# Altium schematic symbol library jlcpcb_2025_04_ferrites_extended_0603.schlib: 833 symbols (part 1 of 4) (continued)
## BLM18KG300TN1D
designator FB?  Impedance @ Frequency: 30Ω@100MHz
Ferrite, 30Ω@100MHz, ±25%, 10mΩ, 5A, SMD 0603; Manufacturer: Murata Electronics; Manufacturer Part Number: BLM18KG300TN1D; Package Size: 0603; JLCPCB Basic Part: No; JLCPCB Part Number: C88982; Supplier 1: LCSC; Category: Ferrite Beads; Supplier Part Number 1: C88982; Tolerance: ±25%; Rated Current: 5A; DC Resistance: 10mΩ; RoHS: Yes; ComponentLink1Description: Datasheet; ComponentLink1URL: https://wmsc.lcsc.com/wmsc/upload/file/pdf/v2/lcsc/2304140030_Murata-Electronics-BLM18KG300TN1D_C88982.pdf; ComponentLink2Description: JLCPCB Part URL; ComponentLink2URL: https://jlcpcb.com/partdetail/C88982; ComponentLink3Description: LCSC Part URL; ComponentLink3URL: https://lcsc.com/product-detail/Ferrite-Beads_Murata-Electronics-Murata-Electronics-BLM18KG300TN1D_C88982.html
footprint FB-0603 (0603 (1608M) Ferrite)
pins: 1, 2

## BLM18KG300TZ1D
designator FB?  Impedance @ Frequency: 300Ω@100MHz
Ferrite, 300Ω@100MHz, 10mΩ, SMD 0603; Manufacturer: Murata Electronics; Manufacturer Part Number: BLM18KG300TZ1D; Package Size: 0603; JLCPCB Basic Part: No; JLCPCB Part Number: C596493; Supplier 1: LCSC; Category: Ferrite Beads; Supplier Part Number 1: C596493; DC Resistance: 10mΩ; RoHS: Yes; ComponentLink1Description: Datasheet; ComponentLink1URL: https://wmsc.lcsc.com/wmsc/upload/file/pdf/v2/lcsc/2304140030_Murata-Electronics-BLM18KG300TZ1D_C596493.pdf; ComponentLink2Description: JLCPCB Part URL; ComponentLink2URL: https://jlcpcb.com/partdetail/C596493; ComponentLink3Description: LCSC Part URL; ComponentLink3URL: https://lcsc.com/product-detail/Ferrite-Beads_Murata-Electronics-Murata-Electronics-BLM18KG300TZ1D_C596493.html
pins: 1, 2

## BLM18KG331SH1D
designator FB?  Impedance @ Frequency: 330Ω@100MHz
Ferrite, 330Ω@100MHz, ±25%, 80mΩ, 1.7A, SMD 0603; Manufacturer: Murata Electronics; Manufacturer Part Number: BLM18KG331SH1D; Package Size: 0603; JLCPCB Basic Part: No; JLCPCB Part Number: C710376; Supplier 1: LCSC; Category: Ferrite Beads; Supplier Part Number 1: C710376; Tolerance: ±25%; Rated Current: 1.7A; DC Resistance: 80mΩ; RoHS: Yes; ComponentLink1Description: Datasheet; ComponentLink1URL: https://wmsc.lcsc.com/wmsc/upload/file/pdf/v2/lcsc/2304140030_Murata-Electronics-BLM18KG331SH1D_C710376.pdf; ComponentLink2Description: JLCPCB Part URL; ComponentLink2URL: https://jlcpcb.com/partdetail/C710376; ComponentLink3Description: LCSC Part URL; ComponentLink3URL: https://lcsc.com/product-detail/Ferrite-Beads_Murata-Electronics-Murata-Electronics-BLM18KG331SH1D_C710376.html
footprint FB-0603 (0603 (1608M) Ferrite)
pins: 1, 2

## BLM18KG331SN1D
designator FB?  Impedance @ Frequency: 330Ω@100MHz
Ferrite, 330Ω@100MHz, ±25%, 80mΩ, 1.7A, SMD 0603; Manufacturer: Murata Electronics; Manufacturer Part Number: BLM18KG331SN1D; Package Size: 0603; JLCPCB Basic Part: No; JLCPCB Part Number: C85832; Supplier 1: LCSC; Category: Ferrite Beads; Supplier Part Number 1: C85832; Tolerance: ±25%; Rated Current: 1.7A; DC Resistance: 80mΩ; RoHS: Yes; ComponentLink1Description: Datasheet; ComponentLink1URL: https://wmsc.lcsc.com/wmsc/upload/file/pdf/v2/lcsc/2304140030_Murata-Electronics-BLM18KG331SN1D_C85832.pdf; ComponentLink2Description: JLCPCB Part URL; ComponentLink2URL: https://jlcpcb.com/partdetail/C85832; ComponentLink3Description: LCSC Part URL; ComponentLink3URL: https://lcsc.com/product-detail/Ferrite-Beads_Murata-Electronics-Murata-Electronics-BLM18KG331SN1D_C85832.html
footprint FB-0603 (0603 (1608M) Ferrite)
pins: 1, 2

## BLM18KG331SZ1D
designator FB?  Impedance @ Frequency: 330Ω@100MHz
Ferrite, 330Ω@100MHz, ±25%, 80mΩ, 1.7A, SMD 0603; Manufacturer: Murata Electronics; Manufacturer Part Number: BLM18KG331SZ1D; Package Size: 0603; JLCPCB Basic Part: No; JLCPCB Part Number: C710377; Supplier 1: LCSC; Category: Ferrite Beads; Supplier Part Number 1: C710377; Tolerance: ±25%; Rated Current: 1.7A; DC Resistance: 80mΩ; RoHS: Yes; ComponentLink1Description: Datasheet; ComponentLink1URL: https://wmsc.lcsc.com/wmsc/upload/file/pdf/v2/lcsc/2304140030_Murata-Electronics-BLM18KG331SZ1D_C710377.pdf; ComponentLink2Description: JLCPCB Part URL; ComponentLink2URL: https://jlcpcb.com/partdetail/C710377; ComponentLink3Description: LCSC Part URL; ComponentLink3URL: https://lcsc.com/product-detail/Ferrite-Beads_Murata-Electronics-Murata-Electronics-BLM18KG331SZ1D_C710377.html
footprint FB-0603 (0603 (1608M) Ferrite)
pins: 1, 2

## BLM18KG471SN1D
designator FB?  Impedance @ Frequency: 470Ω@100MHz
Ferrite, 470Ω@100MHz, ±25%, 130mΩ, 1.5A, SMD 0603; Manufacturer: Murata Electronics; Manufacturer Part Number: BLM18KG471SN1D; Package Size: 0603; JLCPCB Basic Part: No; JLCPCB Part Number: C413961; Supplier 1: LCSC; Category: Ferrite Beads; Supplier Part Number 1: C413961; Tolerance: ±25%; Rated Current: 1.5A; DC Resistance: 130mΩ; RoHS: Yes; ComponentLink1Description: Datasheet; ComponentLink1URL: https://wmsc.lcsc.com/wmsc/upload/file/pdf/v2/lcsc/1912111437_Murata-Electronics-BLM18KG471SN1D_C413961.pdf; ComponentLink2Description: JLCPCB Part URL; ComponentLink2URL: https://jlcpcb.com/partdetail/C413961; ComponentLink3Description: LCSC Part URL; ComponentLink3URL: https://lcsc.com/product-detail/Ferrite-Beads_Murata-Electronics-Murata-Electronics-BLM18KG471SN1D_C413961.html
footprint FB-0603 (0603 (1608M) Ferrite)
pins: 1, 2

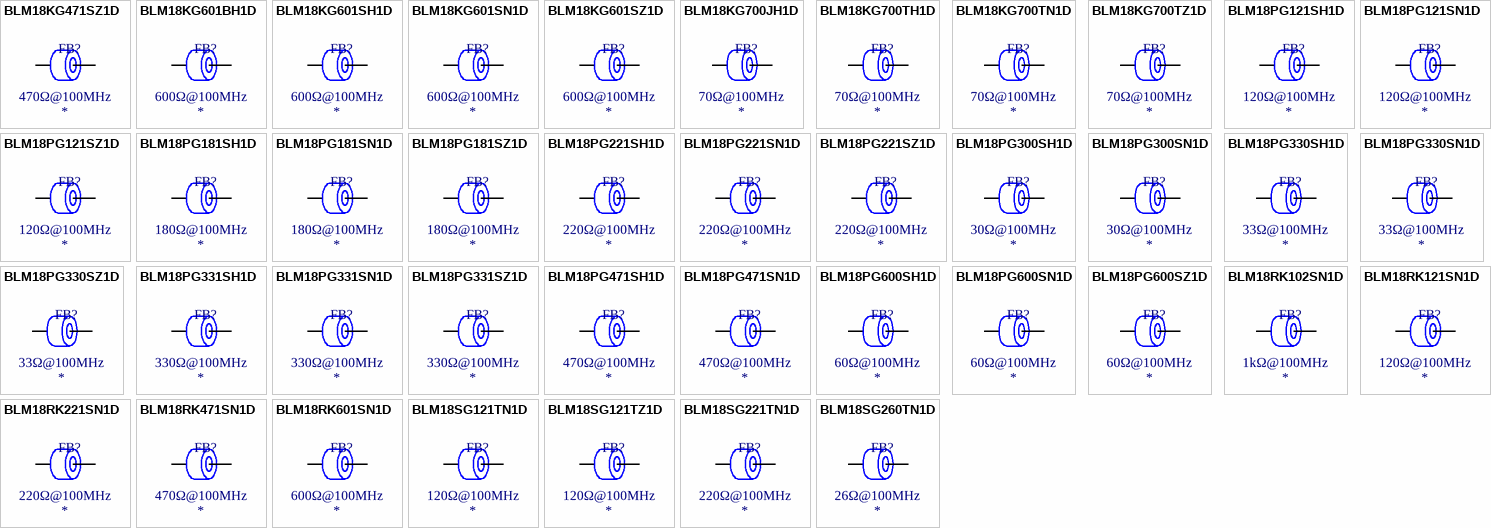
[diagram p4: symbols BLM18KG471SZ1D to BLM18SG260TN1D]

## BLM18KG471SZ1D
designator FB?  Impedance @ Frequency: 470Ω@100MHz
Ferrite, 470Ω@100MHz, ±25%, 130mΩ, 1.5A, SMD 0603; Manufacturer: Murata Electronics; Manufacturer Part Number: BLM18KG471SZ1D; Package Size: 0603; JLCPCB Basic Part: No; JLCPCB Part Number: C2661478; Supplier 1: LCSC; Category: Ferrite Beads; Supplier Part Number 1: C2661478; Tolerance: ±25%; Rated Current: 1.5A; DC Resistance: 130mΩ; RoHS: Yes; ComponentLink1Description: Datasheet; ComponentLink1URL: https://wmsc.lcsc.com/wmsc/upload/file/pdf/v2/lcsc/2304140030_Murata-Electronics-BLM18KG471SZ1D_C2661478.pdf; ComponentLink2Description: JLCPCB Part URL; ComponentLink2URL: https://jlcpcb.com/partdetail/C2661478; ComponentLink3Description: LCSC Part URL; ComponentLink3URL: https://lcsc.com/product-detail/Ferrite-Beads_Murata-Electronics-Murata-Electronics-BLM18KG471SZ1D_C2661478.html
footprint FB-0603 (0603 (1608M) Ferrite)
pins: 1, 2

## BLM18KG601BH1D
designator FB?  Impedance @ Frequency: 600Ω@100MHz
Ferrite, 600Ω@100MHz, 150mΩ, SMD 0603; Manufacturer: Murata Electronics; Manufacturer Part Number: BLM18KG601BH1D; Package Size: 0603; JLCPCB Basic Part: No; JLCPCB Part Number: C668302; Supplier 1: LCSC; Category: Ferrite Beads; Supplier Part Number 1: C668302; DC Resistance: 150mΩ; RoHS: Yes; ComponentLink1Description: Datasheet; ComponentLink1URL: https://wmsc.lcsc.com/wmsc/upload/file/pdf/v2/lcsc/2302070930_Murata-Electronics-BLM18KG601BH1D_C668302.pdf; ComponentLink2Description: JLCPCB Part URL; ComponentLink2URL: https://jlcpcb.com/partdetail/C668302; ComponentLink3Description: LCSC Part URL; ComponentLink3URL: https://lcsc.com/product-detail/Ferrite-Beads_Murata-Electronics-Murata-Electronics-BLM18KG601BH1D_C668302.html
pins: 1, 2

## BLM18KG601SH1D
designator FB?  Impedance @ Frequency: 600Ω@100MHz
Ferrite, 600Ω@100MHz, ±25%, 150mΩ, 1.3A, SMD 0603; Manufacturer: Murata Electronics; Manufacturer Part Number: BLM18KG601SH1D; Package Size: 0603; JLCPCB Basic Part: No; JLCPCB Part Number: C710379; Supplier 1: LCSC; Category: Ferrite Beads; Supplier Part Number 1: C710379; Tolerance: ±25%; Rated Current: 1.3A; DC Resistance: 150mΩ; RoHS: Yes; ComponentLink1Description: Datasheet; ComponentLink1URL: https://wmsc.lcsc.com/wmsc/upload/file/pdf/v2/lcsc/2304140030_Murata-Electronics-BLM18KG601SH1D_C710379.pdf; ComponentLink2Description: JLCPCB Part URL; ComponentLink2URL: https://jlcpcb.com/partdetail/C710379; ComponentLink3Description: LCSC Part URL; ComponentLink3URL: https://lcsc.com/product-detail/Ferrite-Beads_Murata-Electronics-Murata-Electronics-BLM18KG601SH1D_C710379.html
footprint FB-0603 (0603 (1608M) Ferrite)
pins: 1, 2

## BLM18KG601SN1D
designator FB?  Impedance @ Frequency: 600Ω@100MHz
Ferrite, 600Ω@100MHz, ±25%, 150mΩ, 1.3A, SMD 0603; Manufacturer: Murata Electronics; Manufacturer Part Number: BLM18KG601SN1D; Package Size: 0603; JLCPCB Basic Part: No; JLCPCB Part Number: C85833; Supplier 1: LCSC; Category: Ferrite Beads; Supplier Part Number 1: C85833; Tolerance: ±25%; Rated Current: 1.3A; DC Resistance: 150mΩ; RoHS: Yes; ComponentLink1Description: Datasheet; ComponentLink1URL: https://wmsc.lcsc.com/wmsc/upload/file/pdf/v2/lcsc/2304140030_Murata-Electronics-BLM18KG601SN1D_C85833.pdf; ComponentLink2Description: JLCPCB Part URL; ComponentLink2URL: https://jlcpcb.com/partdetail/C85833; ComponentLink3Description: LCSC Part URL; ComponentLink3URL: https://lcsc.com/product-detail/Ferrite-Beads_Murata-Electronics-Murata-Electronics-BLM18KG601SN1D_C85833.html
footprint FB-0603 (0603 (1608M) Ferrite)
pins: 1, 2

## BLM18KG601SZ1D
designator FB?  Impedance @ Frequency: 600Ω@100MHz
Ferrite, 600Ω@100MHz, ±25%, 150mΩ, 1.3A, SMD 0603; Manufacturer: Murata Electronics; Manufacturer Part Number: BLM18KG601SZ1D; Package Size: 0603; JLCPCB Basic Part: No; JLCPCB Part Number: C710380; Supplier 1: LCSC; Category: Ferrite Beads; Supplier Part Number 1: C710380; Tolerance: ±25%; Rated Current: 1.3A; DC Resistance: 150mΩ; RoHS: Yes; ComponentLink1Description: Datasheet; ComponentLink1URL: https://wmsc.lcsc.com/wmsc/upload/file/pdf/v2/lcsc/2304140030_Murata-Electronics-BLM18KG601SZ1D_C710380.pdf; ComponentLink2Description: JLCPCB Part URL; ComponentLink2URL: https://jlcpcb.com/partdetail/C710380; ComponentLink3Description: LCSC Part URL; ComponentLink3URL: https://lcsc.com/product-detail/Ferrite-Beads_Murata-Electronics-Murata-Electronics-BLM18KG601SZ1D_C710380.html
footprint FB-0603 (0603 (1608M) Ferrite)
pins: 1, 2

## BLM18KG700JH1D
designator FB?  Impedance @ Frequency: 70Ω@100MHz
Ferrite, 70Ω@100MHz, ±25%, 22mΩ, 2.2A, SMD 0603; Manufacturer: Murata Electronics; Manufacturer Part Number: BLM18KG700JH1D; Package Size: 0603; JLCPCB Basic Part: No; JLCPCB Part Number: C596492; Supplier 1: LCSC; Category: Ferrite Beads; Supplier Part Number 1: C596492; Tolerance: ±25%; Rated Current: 2.2A; DC Resistance: 22mΩ; RoHS: Yes; ComponentLink1Description: Datasheet; ComponentLink1URL: https://wmsc.lcsc.com/wmsc/upload/file/pdf/v2/lcsc/2304140030_Murata-Electronics-BLM18KG700JH1D_C596492.pdf; ComponentLink2Description: JLCPCB Part URL; ComponentLink2URL: https://jlcpcb.com/partdetail/C596492; ComponentLink3Description: LCSC Part URL; ComponentLink3URL: https://lcsc.com/product-detail/Ferrite-Beads_Murata-Electronics-Murata-Electronics-BLM18KG700JH1D_C596492.html
footprint FB-0603 (0603 (1608M) Ferrite)
pins: 1, 2

## BLM18KG700TH1D
designator FB?  Impedance @ Frequency: 70Ω@100MHz
Ferrite, 70Ω@100MHz, ±25%, 22mΩ, 3.5A, SMD 0603; Manufacturer: Murata Electronics; Manufacturer Part Number: BLM18KG700TH1D; Package Size: 0603; JLCPCB Basic Part: No; JLCPCB Part Number: C710381; Supplier 1: LCSC; Category: Ferrite Beads; Supplier Part Number 1: C710381; Tolerance: ±25%; Rated Current: 3.5A; DC Resistance: 22mΩ; RoHS: Yes; ComponentLink1Description: Datasheet; ComponentLink1URL: https://wmsc.lcsc.com/wmsc/upload/file/pdf/v2/lcsc/2201131100_Murata-Electronics-BLM18KG700TH1D_C710381.pdf; ComponentLink2Description: JLCPCB Part URL; ComponentLink2URL: https://jlcpcb.com/partdetail/C710381; ComponentLink3Description: LCSC Part URL; ComponentLink3URL: https://lcsc.com/product-detail/Ferrite-Beads_Murata-Electronics-Murata-Electronics-BLM18KG700TH1D_C710381.html
footprint FB-0603 (0603 (1608M) Ferrite)
pins: 1, 2

## BLM18KG700TN1D
designator FB?  Impedance @ Frequency: 70Ω@100MHz
Ferrite, 70Ω@100MHz, ±25%, 22mΩ, 3.5A, SMD 0603; Manufacturer: Murata Electronics; Manufacturer Part Number: BLM18KG700TN1D; Package Size: 0603; JLCPCB Basic Part: No; JLCPCB Part Number: C113029; Supplier 1: LCSC; Category: Ferrite Beads; Supplier Part Number 1: C113029; Tolerance: ±25%; Rated Current: 3.5A; DC Resistance: 22mΩ; RoHS: Yes; ComponentLink1Description: Datasheet; ComponentLink1URL: https://wmsc.lcsc.com/wmsc/upload/file/pdf/v2/lcsc/2304140030_Murata-Electronics-BLM18KG700TN1D_C113029.pdf; ComponentLink2Description: JLCPCB Part URL; ComponentLink2URL: https://jlcpcb.com/partdetail/C113029; ComponentLink3Description: LCSC Part URL; ComponentLink3URL: https://lcsc.com/product-detail/Ferrite-Beads_Murata-Electronics-Murata-Electronics-BLM18KG700TN1D_C113029.html
footprint FB-0603 (0603 (1608M) Ferrite)
pins: 1, 2

## BLM18KG700TZ1D
designator FB?  Impedance @ Frequency: 70Ω@100MHz
Ferrite, 70Ω@100MHz, ±25%, 22mΩ, 3.5A, SMD 0603; Manufacturer: Murata Electronics; Manufacturer Part Number: BLM18KG700TZ1D; Package Size: 0603; JLCPCB Basic Part: No; JLCPCB Part Number: C710382; Supplier 1: LCSC; Category: Ferrite Beads; Supplier Part Number 1: C710382; Tolerance: ±25%; Rated Current: 3.5A; DC Resistance: 22mΩ; RoHS: Yes; ComponentLink1Description: Datasheet; ComponentLink1URL: https://wmsc.lcsc.com/wmsc/upload/file/pdf/v2/lcsc/2304140030_Murata-Electronics-BLM18KG700TZ1D_C710382.pdf; ComponentLink2Description: JLCPCB Part URL; ComponentLink2URL: https://jlcpcb.com/partdetail/C710382; ComponentLink3Description: LCSC Part URL; ComponentLink3URL: https://lcsc.com/product-detail/Ferrite-Beads_Murata-Electronics-Murata-Electronics-BLM18KG700TZ1D_C710382.html
footprint FB-0603 (0603 (1608M) Ferrite)
pins: 1, 2

## BLM18PG121SH1D
designator FB?  Impedance @ Frequency: 120Ω@100MHz
Ferrite, 120Ω@100MHz, ±25%, 50mΩ, 2A, SMD 0603; Manufacturer: Murata Electronics; Manufacturer Part Number: BLM18PG121SH1D; Package Size: 0603; JLCPCB Basic Part: No; JLCPCB Part Number: C354394; Supplier 1: LCSC; Category: Ferrite Beads; Supplier Part Number 1: C354394; Tolerance: ±25%; Rated Current: 2A; DC Resistance: 50mΩ; RoHS: Yes; ComponentLink1Description: Datasheet; ComponentLink1URL: https://wmsc.lcsc.com/wmsc/upload/file/pdf/v2/lcsc/2304140030_Murata-Electronics-BLM18PG121SH1D_C354394.pdf; ComponentLink2Description: JLCPCB Part URL; ComponentLink2URL: https://jlcpcb.com/partdetail/C354394; ComponentLink3Description: LCSC Part URL; ComponentLink3URL: https://lcsc.com/product-detail/Ferrite-Beads_Murata-Electronics-Murata-Electronics-BLM18PG121SH1D_C354394.html
footprint FB-0603 (0603 (1608M) Ferrite)
pins: 1, 2

## BLM18PG121SN1D
designator FB?  Impedance @ Frequency: 120Ω@100MHz
Ferrite, 120Ω@100MHz, ±25%, 50mΩ, 2A, SMD 0603; Manufacturer: Murata Electronics; Manufacturer Part Number: BLM18PG121SN1D; Package Size: 0603; JLCPCB Basic Part: No; JLCPCB Part Number: C14709; Supplier 1: LCSC; Category: Ferrite Beads; Supplier Part Number 1: C14709; Tolerance: ±25%; Rated Current: 2A; DC Resistance: 50mΩ; RoHS: Yes; ComponentLink1Description: Datasheet; ComponentLink1URL: https://wmsc.lcsc.com/wmsc/upload/file/pdf/v2/lcsc/2304140030_Murata-Electronics-BLM18PG121SN1D_C14709.pdf; ComponentLink2Description: JLCPCB Part URL; ComponentLink2URL: https://jlcpcb.com/partdetail/C14709; ComponentLink3Description: LCSC Part URL; ComponentLink3URL: https://lcsc.com/product-detail/Ferrite-Beads_Murata-Electronics-Murata-Electronics-BLM18PG121SN1D_C14709.html
footprint FB-0603 (0603 (1608M) Ferrite)
pins: 1, 2

## BLM18PG121SZ1D
designator FB?  Impedance @ Frequency: 120Ω@100MHz
Ferrite, 120Ω@100MHz, ±25%, 50mΩ, 2A, SMD 0603; Manufacturer: Murata Electronics; Manufacturer Part Number: BLM18PG121SZ1D; Package Size: 0603; JLCPCB Basic Part: No; JLCPCB Part Number: C160983; Supplier 1: LCSC; Category: Ferrite Beads; Supplier Part Number 1: C160983; Tolerance: ±25%; Rated Current: 2A; DC Resistance: 50mΩ; RoHS: Yes; ComponentLink1Description: Datasheet; ComponentLink1URL: https://wmsc.lcsc.com/wmsc/upload/file/pdf/v2/lcsc/2304140030_Murata-Electronics-BLM18PG121SZ1D_C160983.pdf; ComponentLink2Description: JLCPCB Part URL; ComponentLink2URL: https://jlcpcb.com/partdetail/C160983; ComponentLink3Description: LCSC Part URL; ComponentLink3URL: https://lcsc.com/product-detail/Ferrite-Beads_Murata-Electronics-Murata-Electronics-BLM18PG121SZ1D_C160983.html
footprint FB-0603 (0603 (1608M) Ferrite)
pins: 1, 2

## BLM18PG181SH1D
designator FB?  Impedance @ Frequency: 180Ω@100MHz
Ferrite, 180Ω@100MHz, ±25%, 90mΩ, 1.5A, SMD 0603; Manufacturer: Murata Electronics; Manufacturer Part Number: BLM18PG181SH1D; Package Size: 0603; JLCPCB Basic Part: No; JLCPCB Part Number: C710383; Supplier 1: LCSC; Category: Ferrite Beads; Supplier Part Number 1: C710383; Tolerance: ±25%; Rated Current: 1.5A; DC Resistance: 90mΩ; RoHS: Yes; ComponentLink1Description: Datasheet; ComponentLink1URL: https://wmsc.lcsc.com/wmsc/upload/file/pdf/v2/lcsc/2304140030_Murata-Electronics-BLM18PG181SH1D_C710383.pdf; ComponentLink2Description: JLCPCB Part URL; ComponentLink2URL: https://jlcpcb.com/partdetail/C710383; ComponentLink3Description: LCSC Part URL; ComponentLink3URL: https://lcsc.com/product-detail/Ferrite-Beads_Murata-Electronics-Murata-Electronics-BLM18PG181SH1D_C710383.html
footprint FB-0603 (0603 (1608M) Ferrite)
pins: 1, 2

## BLM18PG181SN1D
designator FB?  Impedance @ Frequency: 180Ω@100MHz
Ferrite, 180Ω@100MHz, ±25%, 90mΩ, 1.5A, SMD 0603; Manufacturer: Murata Electronics; Manufacturer Part Number: BLM18PG181SN1D; Package Size: 0603; JLCPCB Basic Part: No; JLCPCB Part Number: C82850; Supplier 1: LCSC; Category: Ferrite Beads; Supplier Part Number 1: C82850; Tolerance: ±25%; Rated Current: 1.5A; DC Resistance: 90mΩ; RoHS: Yes; ComponentLink1Description: Datasheet; ComponentLink1URL: https://wmsc.lcsc.com/wmsc/upload/file/pdf/v2/lcsc/2304140030_Murata-Electronics-BLM18PG181SN1D_C82850.pdf; ComponentLink2Description: JLCPCB Part URL; ComponentLink2URL: https://jlcpcb.com/partdetail/C82850; ComponentLink3Description: LCSC Part URL; ComponentLink3URL: https://lcsc.com/product-detail/Ferrite-Beads_Murata-Electronics-Murata-Electronics-BLM18PG181SN1D_C82850.html
footprint FB-0603 (0603 (1608M) Ferrite)
pins: 1, 2

## BLM18PG181SZ1D
designator FB?  Impedance @ Frequency: 180Ω@100MHz
Ferrite, 180Ω@100MHz, 90mΩ, SMD 0603; Manufacturer: Murata Electronics; Manufacturer Part Number: BLM18PG181SZ1D; Package Size: 0603; JLCPCB Basic Part: No; JLCPCB Part Number: C560070; Supplier 1: LCSC; Category: Ferrite Beads; Supplier Part Number 1: C560070; DC Resistance: 90mΩ; RoHS: Yes; ComponentLink1Description: Datasheet; ComponentLink1URL: https://wmsc.lcsc.com/wmsc/upload/file/pdf/v2/lcsc/2008070932_Murata-Electronics-BLM18PG181SZ1D_C560070.pdf; ComponentLink2Description: JLCPCB Part URL; ComponentLink2URL: https://jlcpcb.com/partdetail/C560070; ComponentLink3Description: LCSC Part URL; ComponentLink3URL: https://lcsc.com/product-detail/Ferrite-Beads_Murata-Electronics-Murata-Electronics-BLM18PG181SZ1D_C560070.html
pins: 1, 2

## BLM18PG221SH1D
designator FB?  Impedance @ Frequency: 220Ω@100MHz
Ferrite, 220Ω@100MHz, 100mΩ, SMD 0603; Manufacturer: Murata Electronics; Manufacturer Part Number: BLM18PG221SH1D; Package Size: 0603; JLCPCB Basic Part: No; JLCPCB Part Number: C711569; Supplier 1: LCSC; Category: Ferrite Beads; Supplier Part Number 1: C711569; DC Resistance: 100mΩ; RoHS: Yes; ComponentLink1Description: Datasheet; ComponentLink1URL: https://wmsc.lcsc.com/wmsc/upload/file/pdf/v2/lcsc/2304140030_Murata-Electronics-BLM18PG221SH1D_C711569.pdf; ComponentLink2Description: JLCPCB Part URL; ComponentLink2URL: https://jlcpcb.com/partdetail/C711569; ComponentLink3Description: LCSC Part URL; ComponentLink3URL: https://lcsc.com/product-detail/Ferrite-Beads_Murata-Electronics-Murata-Electronics-BLM18PG221SH1D_C711569.html
pins: 1, 2

## BLM18PG221SN1D
designator FB?  Impedance @ Frequency: 220Ω@100MHz
Ferrite, 220Ω@100MHz, ±25%, 100mΩ, 1.4A, SMD 0603; Manufacturer: Murata Electronics; Manufacturer Part Number: BLM18PG221SN1D; Package Size: 0603; JLCPCB Basic Part: No; JLCPCB Part Number: C80165; Supplier 1: LCSC; Category: Ferrite Beads; Supplier Part Number 1: C80165; Tolerance: ±25%; Rated Current: 1.4A; DC Resistance: 100mΩ; RoHS: Yes; ComponentLink1Description: Datasheet; ComponentLink1URL: https://wmsc.lcsc.com/wmsc/upload/file/pdf/v2/lcsc/2304140030_Murata-Electronics-BLM18PG221SN1D_C80165.pdf; ComponentLink2Description: JLCPCB Part URL; ComponentLink2URL: https://jlcpcb.com/partdetail/C80165; ComponentLink3Description: LCSC Part URL; ComponentLink3URL: https://lcsc.com/product-detail/Ferrite-Beads_Murata-Electronics-Murata-Electronics-BLM18PG221SN1D_C80165.html
footprint FB-0603 (0603 (1608M) Ferrite)
pins: 1, 2

## BLM18PG221SZ1D
designator FB?  Impedance @ Frequency: 220Ω@100MHz
Ferrite, 220Ω@100MHz, ±25%, 100mΩ, 1.4A, SMD 0603; Manufacturer: Murata Electronics; Manufacturer Part Number: BLM18PG221SZ1D; Package Size: 0603; JLCPCB Basic Part: No; JLCPCB Part Number: C710384; Supplier 1: LCSC; Category: Ferrite Beads; Supplier Part Number 1: C710384; Tolerance: ±25%; Rated Current: 1.4A; DC Resistance: 100mΩ; RoHS: Yes; ComponentLink1Description: Datasheet; ComponentLink1URL: https://wmsc.lcsc.com/wmsc/upload/file/pdf/v2/lcsc/2304140030_Murata-Electronics-BLM18PG221SZ1D_C710384.pdf; ComponentLink2Description: JLCPCB Part URL; ComponentLink2URL: https://jlcpcb.com/partdetail/C710384; ComponentLink3Description: LCSC Part URL; ComponentLink3URL: https://lcsc.com/product-detail/Ferrite-Beads_Murata-Electronics-Murata-Electronics-BLM18PG221SZ1D_C710384.html
footprint FB-0603 (0603 (1608M) Ferrite)
pins: 1, 2

## BLM18PG300SH1D
designator FB?  Impedance @ Frequency: 30Ω@100MHz
Ferrite, 30Ω@100MHz, ±25%, 50mΩ, 1A, SMD 0603; Manufacturer: Murata Electronics; Manufacturer Part Number: BLM18PG300SH1D; Package Size: 0603; JLCPCB Basic Part: No; JLCPCB Part Number: C437405; Supplier 1: LCSC; Category: Ferrite Beads; Supplier Part Number 1: C437405; Tolerance: ±25%; Rated Current: 1A; DC Resistance: 50mΩ; RoHS: Yes; ComponentLink1Description: Datasheet; ComponentLink1URL: https://wmsc.lcsc.com/wmsc/upload/file/pdf/v2/lcsc/2304140030_Murata-Electronics-BLM18PG300SH1D_C437405.pdf; ComponentLink2Description: JLCPCB Part URL; ComponentLink2URL: https://jlcpcb.com/partdetail/C437405; ComponentLink3Description: LCSC Part URL; ComponentLink3URL: https://lcsc.com/product-detail/Ferrite-Beads_Murata-Electronics-Murata-Electronics-BLM18PG300SH1D_C437405.html
footprint FB-0603 (0603 (1608M) Ferrite)
pins: 1, 2

## BLM18PG300SN1D
designator FB?  Impedance @ Frequency: 30Ω@100MHz
Ferrite, 30Ω@100MHz, ±25%, 50mΩ, 1A, SMD 0603; Manufacturer: Murata Electronics; Manufacturer Part Number: BLM18PG300SN1D; Package Size: 0603; JLCPCB Basic Part: No; JLCPCB Part Number: C17305; Supplier 1: LCSC; Category: Ferrite Beads; Supplier Part Number 1: C17305; Tolerance: ±25%; Rated Current: 1A; DC Resistance: 50mΩ; RoHS: Yes; ComponentLink1Description: Datasheet; ComponentLink1URL: https://wmsc.lcsc.com/wmsc/upload/file/pdf/v2/lcsc/1810311122_Murata-Electronics-BLM18PG300SN1D_C17305.pdf; ComponentLink2Description: JLCPCB Part URL; ComponentLink2URL: https://jlcpcb.com/partdetail/C17305; ComponentLink3Description: LCSC Part URL; ComponentLink3URL: https://lcsc.com/product-detail/Ferrite-Beads_Murata-Electronics-Murata-Electronics-BLM18PG300SN1D_C17305.html
footprint FB-0603 (0603 (1608M) Ferrite)
pins: 1, 2

## BLM18PG330SH1D
designator FB?  Impedance @ Frequency: 33Ω@100MHz
Ferrite, 33Ω@100MHz, ±25%, 25mΩ, 3A, SMD 0603; Manufacturer: Murata Electronics; Manufacturer Part Number: BLM18PG330SH1D; Package Size: 0603; JLCPCB Basic Part: No; JLCPCB Part Number: C88983; Supplier 1: LCSC; Category: Ferrite Beads; Supplier Part Number 1: C88983; Tolerance: ±25%; Rated Current: 3A; DC Resistance: 25mΩ; RoHS: Yes; ComponentLink1Description: Datasheet; ComponentLink1URL: https://wmsc.lcsc.com/wmsc/upload/file/pdf/v2/lcsc/2304140030_Murata-Electronics-BLM18PG330SH1D_C88983.pdf; ComponentLink2Description: JLCPCB Part URL; ComponentLink2URL: https://jlcpcb.com/partdetail/C88983; ComponentLink3Description: LCSC Part URL; ComponentLink3URL: https://lcsc.com/product-detail/Ferrite-Beads_Murata-Electronics-Murata-Electronics-BLM18PG330SH1D_C88983.html
footprint FB-0603 (0603 (1608M) Ferrite)
pins: 1, 2

## BLM18PG330SN1D
designator FB?  Impedance @ Frequency: 33Ω@100MHz
Ferrite, 33Ω@100MHz, ±25%, 25mΩ, 3A, SMD 0603; Manufacturer: Murata Electronics; Manufacturer Part Number: BLM18PG330SN1D; Package Size: 0603; JLCPCB Basic Part: No; JLCPCB Part Number: C88984; Supplier 1: LCSC; Category: Ferrite Beads; Supplier Part Number 1: C88984; Tolerance: ±25%; Rated Current: 3A; DC Resistance: 25mΩ; RoHS: Yes; ComponentLink1Description: Datasheet; ComponentLink1URL: https://wmsc.lcsc.com/wmsc/upload/file/pdf/v2/lcsc/2304140030_Murata-Electronics-BLM18PG330SN1D_C88984.pdf; ComponentLink2Description: JLCPCB Part URL; ComponentLink2URL: https://jlcpcb.com/partdetail/C88984; ComponentLink3Description: LCSC Part URL; ComponentLink3URL: https://lcsc.com/product-detail/Ferrite-Beads_Murata-Electronics-Murata-Electronics-BLM18PG330SN1D_C88984.html
footprint FB-0603 (0603 (1608M) Ferrite)
pins: 1, 2

## BLM18PG330SZ1D
designator FB?  Impedance @ Frequency: 33Ω@100MHz
Ferrite, 33Ω@100MHz, 25mΩ, SMD 0603; Manufacturer: Murata Electronics; Manufacturer Part Number: BLM18PG330SZ1D; Package Size: 0603; JLCPCB Basic Part: No; JLCPCB Part Number: C3716705; Supplier 1: LCSC; Category: Ferrite Beads; Supplier Part Number 1: C3716705; DC Resistance: 25mΩ; RoHS: Yes; ComponentLink1Description: Datasheet; ComponentLink1URL: https://wmsc.lcsc.com/wmsc/upload/file/pdf/v2/lcsc/2308111557_Murata-Electronics-BLM18PG330SZ1D_C3716705.pdf; ComponentLink2Description: JLCPCB Part URL; ComponentLink2URL: https://jlcpcb.com/partdetail/C3716705; ComponentLink3Description: LCSC Part URL; ComponentLink3URL: https://lcsc.com/product-detail/Ferrite-Beads_Murata-Electronics-Murata-Electronics-BLM18PG330SZ1D_C3716705.html
pins: 1, 2

## BLM18PG331SH1D
designator FB?  Impedance @ Frequency: 330Ω@100MHz
Ferrite, 330Ω@100MHz, ±25%, 150mΩ, 1.2A, SMD 0603; Manufacturer: Murata Electronics; Manufacturer Part Number: BLM18PG331SH1D; Package Size: 0603; JLCPCB Basic Part: No; JLCPCB Part Number: C710386; Supplier 1: LCSC; Category: Ferrite Beads; Supplier Part Number 1: C710386; Tolerance: ±25%; Rated Current: 1.2A; DC Resistance: 150mΩ; RoHS: Yes; ComponentLink1Description: Datasheet; ComponentLink1URL: https://wmsc.lcsc.com/wmsc/upload/file/pdf/v2/lcsc/2304140030_Murata-Electronics-BLM18PG331SH1D_C710386.pdf; ComponentLink2Description: JLCPCB Part URL; ComponentLink2URL: https://jlcpcb.com/partdetail/C710386; ComponentLink3Description: LCSC Part URL; ComponentLink3URL: https://lcsc.com/product-detail/Ferrite-Beads_Murata-Electronics-Murata-Electronics-BLM18PG331SH1D_C710386.html
footprint FB-0603 (0603 (1608M) Ferrite)
pins: 1, 2

## BLM18PG331SN1D
designator FB?  Impedance @ Frequency: 330Ω@100MHz
Ferrite, 330Ω@100MHz, ±25%, 150mΩ, 1.2A, SMD 0603; Manufacturer: Murata Electronics; Manufacturer Part Number: BLM18PG331SN1D; Package Size: 0603; JLCPCB Basic Part: No; JLCPCB Part Number: C79913; Supplier 1: LCSC; Category: Ferrite Beads; Supplier Part Number 1: C79913; Tolerance: ±25%; Rated Current: 1.2A; DC Resistance: 150mΩ; RoHS: Yes; ComponentLink1Description: Datasheet; ComponentLink1URL: https://wmsc.lcsc.com/wmsc/upload/file/pdf/v2/lcsc/2304140030_Murata-Electronics-BLM18PG331SN1D_C79913.pdf; ComponentLink2Description: JLCPCB Part URL; ComponentLink2URL: https://jlcpcb.com/partdetail/C79913; ComponentLink3Description: LCSC Part URL; ComponentLink3URL: https://lcsc.com/product-detail/Ferrite-Beads_Murata-Electronics-Murata-Electronics-BLM18PG331SN1D_C79913.html
footprint FB-0603 (0603 (1608M) Ferrite)
pins: 1, 2

## BLM18PG331SZ1D
designator FB?  Impedance @ Frequency: 330Ω@100MHz
Ferrite, 330Ω@100MHz, ±25%, 150mΩ, 1.2A, SMD 0603; Manufacturer: Murata Electronics; Manufacturer Part Number: BLM18PG331SZ1D; Package Size: 0603; JLCPCB Basic Part: No; JLCPCB Part Number: C160984; Supplier 1: LCSC; Category: Ferrite Beads; Supplier Part Number 1: C160984; Tolerance: ±25%; Rated Current: 1.2A; DC Resistance: 150mΩ; RoHS: Yes; ComponentLink1Description: Datasheet; ComponentLink1URL: https://wmsc.lcsc.com/wmsc/upload/file/pdf/v2/lcsc/2304140030_Murata-Electronics-BLM18PG331SZ1D_C160984.pdf; ComponentLink2Description: JLCPCB Part URL; ComponentLink2URL: https://jlcpcb.com/partdetail/C160984; ComponentLink3Description: LCSC Part URL; ComponentLink3URL: https://lcsc.com/product-detail/Ferrite-Beads_Murata-Electronics-Murata-Electronics-BLM18PG331SZ1D_C160984.html
footprint FB-0603 (0603 (1608M) Ferrite)
pins: 1, 2

## BLM18PG471SH1D
designator FB?  Impedance @ Frequency: 470Ω@100MHz
Ferrite, 470Ω@100MHz, ±25%, 200mΩ, 1A, SMD 0603; Manufacturer: Murata Electronics; Manufacturer Part Number: BLM18PG471SH1D; Package Size: 0603; JLCPCB Basic Part: No; JLCPCB Part Number: C160985; Supplier 1: LCSC; Category: Ferrite Beads; Supplier Part Number 1: C160985; Tolerance: ±25%; Rated Current: 1A; DC Resistance: 200mΩ; RoHS: Yes; ComponentLink1Description: Datasheet; ComponentLink1URL: https://wmsc.lcsc.com/wmsc/upload/file/pdf/v2/lcsc/1810311131_Murata-Electronics-BLM18PG471SH1D_C160985.pdf; ComponentLink2Description: JLCPCB Part URL; ComponentLink2URL: https://jlcpcb.com/partdetail/C160985; ComponentLink3Description: LCSC Part URL; ComponentLink3URL: https://lcsc.com/product-detail/Ferrite-Beads_Murata-Electronics-Murata-Electronics-BLM18PG471SH1D_C160985.html
footprint FB-0603 (0603 (1608M) Ferrite)
pins: 1, 2

## BLM18PG471SN1D
designator FB?  Impedance @ Frequency: 470Ω@100MHz
Ferrite, 470Ω@100MHz, ±25%, 200mΩ, 1A, SMD 0603; Manufacturer: Murata Electronics; Manufacturer Part Number: BLM18PG471SN1D; Package Size: 0603; JLCPCB Basic Part: No; JLCPCB Part Number: C97853; Supplier 1: LCSC; Category: Ferrite Beads; Supplier Part Number 1: C97853; Tolerance: ±25%; Rated Current: 1A; DC Resistance: 200mΩ; RoHS: Yes; ComponentLink1Description: Datasheet; ComponentLink1URL: https://wmsc.lcsc.com/wmsc/upload/file/pdf/v2/lcsc/2304140030_Murata-Electronics-BLM18PG471SN1D_C97853.pdf; ComponentLink2Description: JLCPCB Part URL; ComponentLink2URL: https://jlcpcb.com/partdetail/C97853; ComponentLink3Description: LCSC Part URL; ComponentLink3URL: https://lcsc.com/product-detail/Ferrite-Beads_Murata-Electronics-Murata-Electronics-BLM18PG471SN1D_C97853.html
footprint FB-0603 (0603 (1608M) Ferrite)
pins: 1, 2

## BLM18PG600SH1D
designator FB?  Impedance @ Frequency: 60Ω@100MHz
Ferrite, 60Ω@100MHz, ±25%, 100mΩ, 1A, SMD 0603; Manufacturer: Murata Electronics; Manufacturer Part Number: BLM18PG600SH1D; Package Size: 0603; JLCPCB Basic Part: No; JLCPCB Part Number: C88985; Supplier 1: LCSC; Category: Ferrite Beads; Supplier Part Number 1: C88985; Tolerance: ±25%; Rated Current: 1A; DC Resistance: 100mΩ; RoHS: Yes; ComponentLink1Description: Datasheet; ComponentLink1URL: https://wmsc.lcsc.com/wmsc/upload/file/pdf/v2/lcsc/1810311125_Murata-Electronics-BLM18PG600SH1D_C88985.pdf; ComponentLink2Description: JLCPCB Part URL; ComponentLink2URL: https://jlcpcb.com/partdetail/C88985; ComponentLink3Description: LCSC Part URL; ComponentLink3URL: https://lcsc.com/product-detail/Ferrite-Beads_Murata-Electronics-Murata-Electronics-BLM18PG600SH1D_C88985.html
footprint FB-0603 (0603 (1608M) Ferrite)
pins: 1, 2

## BLM18PG600SN1D
designator FB?  Impedance @ Frequency: 60Ω@100MHz
Ferrite, 60Ω@100MHz, ±25%, 100mΩ, 1A, SMD 0603; Manufacturer: Murata Electronics; Manufacturer Part Number: BLM18PG600SN1D; Package Size: 0603; JLCPCB Basic Part: No; JLCPCB Part Number: C85834; Supplier 1: LCSC; Category: Ferrite Beads; Supplier Part Number 1: C85834; Tolerance: ±25%; Rated Current: 1A; DC Resistance: 100mΩ; RoHS: Yes; ComponentLink1Description: Datasheet; ComponentLink1URL: https://wmsc.lcsc.com/wmsc/upload/file/pdf/v2/lcsc/2304140030_Murata-Electronics-BLM18PG600SN1D_C85834.pdf; ComponentLink2Description: JLCPCB Part URL; ComponentLink2URL: https://jlcpcb.com/partdetail/C85834; ComponentLink3Description: LCSC Part URL; ComponentLink3URL: https://lcsc.com/product-detail/Ferrite-Beads_Murata-Electronics-Murata-Electronics-BLM18PG600SN1D_C85834.html
footprint FB-0603 (0603 (1608M) Ferrite)
pins: 1, 2

## BLM18PG600SZ1D
designator FB?  Impedance @ Frequency: 60Ω@100MHz
Ferrite, 60Ω@100MHz, ±25%, 100mΩ, 1A, SMD 0603; Manufacturer: Murata Electronics; Manufacturer Part Number: BLM18PG600SZ1D; Package Size: 0603; JLCPCB Basic Part: No; JLCPCB Part Number: C710388; Supplier 1: LCSC; Category: Ferrite Beads; Supplier Part Number 1: C710388; Tolerance: ±25%; Rated Current: 1A; DC Resistance: 100mΩ; RoHS: Yes; ComponentLink1Description: Datasheet; ComponentLink1URL: https://wmsc.lcsc.com/wmsc/upload/file/pdf/v2/lcsc/2304140030_Murata-Electronics-BLM18PG600SZ1D_C710388.pdf; ComponentLink2Description: JLCPCB Part URL; ComponentLink2URL: https://jlcpcb.com/partdetail/C710388; ComponentLink3Description: LCSC Part URL; ComponentLink3URL: https://lcsc.com/product-detail/Ferrite-Beads_Murata-Electronics-Murata-Electronics-BLM18PG600SZ1D_C710388.html
footprint FB-0603 (0603 (1608M) Ferrite)
pins: 1, 2

## BLM18RK102SN1D
designator FB?  Impedance @ Frequency: 1kΩ@100MHz
Ferrite, 1kΩ@100MHz, ±25%, 800mΩ, 200mA, SMD 0603; Manufacturer: Murata Electronics; Manufacturer Part Number: BLM18RK102SN1D; Package Size: 0603; JLCPCB Basic Part: No; JLCPCB Part Number: C88986; Supplier 1: LCSC; Category: Ferrite Beads; Supplier Part Number 1: C88986; Tolerance: ±25%; Rated Current: 200mA; DC Resistance: 800mΩ; RoHS: Yes; ComponentLink1Description: Datasheet; ComponentLink1URL: https://wmsc.lcsc.com/wmsc/upload/file/pdf/v2/lcsc/2304140030_Murata-Electronics-BLM18RK102SN1D_C88986.pdf; ComponentLink2Description: JLCPCB Part URL; ComponentLink2URL: https://jlcpcb.com/partdetail/C88986; ComponentLink3Description: LCSC Part URL; ComponentLink3URL: https://lcsc.com/product-detail/Ferrite-Beads_Murata-Electronics-Murata-Electronics-BLM18RK102SN1D_C88986.html
footprint FB-0603 (0603 (1608M) Ferrite)
pins: 1, 2

## BLM18RK121SN1D
designator FB?  Impedance @ Frequency: 120Ω@100MHz
Ferrite, 120Ω@100MHz, ±25%, 250mΩ, 200mA, SMD 0603; Manufacturer: Murata Electronics; Manufacturer Part Number: BLM18RK121SN1D; Package Size: 0603; JLCPCB Basic Part: No; JLCPCB Part Number: C237533; Supplier 1: LCSC; Category: Ferrite Beads; Supplier Part Number 1: C237533; Tolerance: ±25%; Rated Current: 200mA; DC Resistance: 250mΩ; RoHS: Yes; ComponentLink1Description: Datasheet; ComponentLink1URL: https://wmsc.lcsc.com/wmsc/upload/file/pdf/v2/lcsc/2304140030_Murata-Electronics-BLM18RK121SN1D_C237533.pdf; ComponentLink2Description: JLCPCB Part URL; ComponentLink2URL: https://jlcpcb.com/partdetail/C237533; ComponentLink3Description: LCSC Part URL; ComponentLink3URL: https://lcsc.com/product-detail/Ferrite-Beads_Murata-Electronics-Murata-Electronics-BLM18RK121SN1D_C237533.html
footprint FB-0603 (0603 (1608M) Ferrite)
pins: 1, 2

## BLM18RK221SN1D
designator FB?  Impedance @ Frequency: 220Ω@100MHz
Ferrite, 220Ω@100MHz, ±25%, 300mΩ, 200mA, SMD 0603; Manufacturer: Murata Electronics; Manufacturer Part Number: BLM18RK221SN1D; Package Size: 0603; JLCPCB Basic Part: No; JLCPCB Part Number: C265028; Supplier 1: LCSC; Category: Ferrite Beads; Supplier Part Number 1: C265028; Tolerance: ±25%; Rated Current: 200mA; DC Resistance: 300mΩ; RoHS: Yes; ComponentLink1Description: Datasheet; ComponentLink1URL: https://wmsc.lcsc.com/wmsc/upload/file/pdf/v2/lcsc/2304140030_Murata-Electronics-BLM18RK221SN1D_C265028.pdf; ComponentLink2Description: JLCPCB Part URL; ComponentLink2URL: https://jlcpcb.com/partdetail/C265028; ComponentLink3Description: LCSC Part URL; ComponentLink3URL: https://lcsc.com/product-detail/Ferrite-Beads_Murata-Electronics-Murata-Electronics-BLM18RK221SN1D_C265028.html
footprint FB-0603 (0603 (1608M) Ferrite)
pins: 1, 2

## BLM18RK471SN1D
designator FB?  Impedance @ Frequency: 470Ω@100MHz
Ferrite, 470Ω@100MHz, ±25%, 500mΩ, 200mA, SMD 0603; Manufacturer: Murata Electronics; Manufacturer Part Number: BLM18RK471SN1D; Package Size: 0603; JLCPCB Basic Part: No; JLCPCB Part Number: C160986; Supplier 1: LCSC; Category: Ferrite Beads; Supplier Part Number 1: C160986; Tolerance: ±25%; Rated Current: 200mA; DC Resistance: 500mΩ; RoHS: Yes; ComponentLink1Description: Datasheet; ComponentLink1URL: https://wmsc.lcsc.com/wmsc/upload/file/pdf/v2/lcsc/1810311132_Murata-Electronics-BLM18RK471SN1D_C160986.pdf; ComponentLink2Description: JLCPCB Part URL; ComponentLink2URL: https://jlcpcb.com/partdetail/C160986; ComponentLink3Description: LCSC Part URL; ComponentLink3URL: https://lcsc.com/product-detail/Ferrite-Beads_Murata-Electronics-Murata-Electronics-BLM18RK471SN1D_C160986.html
footprint FB-0603 (0603 (1608M) Ferrite)
pins: 1, 2

## BLM18RK601SN1D
designator FB?  Impedance @ Frequency: 600Ω@100MHz
Ferrite, 600Ω@100MHz, ±25%, 600mΩ, 200mA, SMD 0603; Manufacturer: Murata Electronics; Manufacturer Part Number: BLM18RK601SN1D; Package Size: 0603; JLCPCB Basic Part: No; JLCPCB Part Number: C88987; Supplier 1: LCSC; Category: Ferrite Beads; Supplier Part Number 1: C88987; Tolerance: ±25%; Rated Current: 200mA; DC Resistance: 600mΩ; RoHS: Yes; ComponentLink1Description: Datasheet; ComponentLink1URL: https://wmsc.lcsc.com/wmsc/upload/file/pdf/v2/lcsc/2304140030_Murata-Electronics-BLM18RK601SN1D_C88987.pdf; ComponentLink2Description: JLCPCB Part URL; ComponentLink2URL: https://jlcpcb.com/partdetail/C88987; ComponentLink3Description: LCSC Part URL; ComponentLink3URL: https://lcsc.com/product-detail/Ferrite-Beads_Murata-Electronics-Murata-Electronics-BLM18RK601SN1D_C88987.html
footprint FB-0603 (0603 (1608M) Ferrite)
pins: 1, 2

## BLM18SG121TN1D
designator FB?  Impedance @ Frequency: 120Ω@100MHz
Ferrite, 120Ω@100MHz, ±25%, 25mΩ, 3A, SMD 0603; Manufacturer: Murata Electronics; Manufacturer Part Number: BLM18SG121TN1D; Package Size: 0603; JLCPCB Basic Part: No; JLCPCB Part Number: C113030; Supplier 1: LCSC; Category: Ferrite Beads; Supplier Part Number 1: C113030; Tolerance: ±25%; Rated Current: 3A; DC Resistance: 25mΩ; RoHS: Yes; ComponentLink1Description: Datasheet; ComponentLink1URL: https://wmsc.lcsc.com/wmsc/upload/file/pdf/v2/lcsc/2304140030_Murata-Electronics-BLM18SG121TN1D_C113030.pdf; ComponentLink2Description: JLCPCB Part URL; ComponentLink2URL: https://jlcpcb.com/partdetail/C113030; ComponentLink3Description: LCSC Part URL; ComponentLink3URL: https://lcsc.com/product-detail/Ferrite-Beads_Murata-Electronics-Murata-Electronics-BLM18SG121TN1D_C113030.html
footprint FB-0603 (0603 (1608M) Ferrite)
pins: 1, 2

## BLM18SG121TZ1D
designator FB?  Impedance @ Frequency: 120Ω@100MHz
Ferrite, 120Ω@100MHz, ±25%, 25mΩ, 3A, SMD 0603; Manufacturer: Murata Electronics; Manufacturer Part Number: BLM18SG121TZ1D; Package Size: 0603; JLCPCB Basic Part: No; JLCPCB Part Number: C710390; Supplier 1: LCSC; Category: Ferrite Beads; Supplier Part Number 1: C710390; Tolerance: ±25%; Rated Current: 3A; DC Resistance: 25mΩ; RoHS: Yes; ComponentLink1Description: Datasheet; ComponentLink1URL: https://wmsc.lcsc.com/wmsc/upload/file/pdf/v2/lcsc/2304140030_Murata-Electronics-BLM18SG121TZ1D_C710390.pdf; ComponentLink2Description: JLCPCB Part URL; ComponentLink2URL: https://jlcpcb.com/partdetail/C710390; ComponentLink3Description: LCSC Part URL; ComponentLink3URL: https://lcsc.com/product-detail/Ferrite-Beads_Murata-Electronics-Murata-Electronics-BLM18SG121TZ1D_C710390.html
footprint FB-0603 (0603 (1608M) Ferrite)
pins: 1, 2

## BLM18SG221TN1D
designator FB?  Impedance @ Frequency: 220Ω@100MHz
Ferrite, 220Ω@100MHz, ±25%, 40mΩ, 2.5A, SMD 0603; Manufacturer: Murata Electronics; Manufacturer Part Number: BLM18SG221TN1D; Package Size: 0603; JLCPCB Basic Part: No; JLCPCB Part Number: C88988; Supplier 1: LCSC; Category: Ferrite Beads; Supplier Part Number 1: C88988; Tolerance: ±25%; Rated Current: 2.5A; DC Resistance: 40mΩ; RoHS: Yes; ComponentLink1Description: Datasheet; ComponentLink1URL: https://wmsc.lcsc.com/wmsc/upload/file/pdf/v2/lcsc/2304140030_Murata-Electronics-BLM18SG221TN1D_C88988.pdf; ComponentLink2Description: JLCPCB Part URL; ComponentLink2URL: https://jlcpcb.com/partdetail/C88988; ComponentLink3Description: LCSC Part URL; ComponentLink3URL: https://lcsc.com/product-detail/Ferrite-Beads_Murata-Electronics-Murata-Electronics-BLM18SG221TN1D_C88988.html
footprint FB-0603 (0603 (1608M) Ferrite)
pins: 1, 2

## BLM18SG260TN1D
designator FB?  Impedance @ Frequency: 26Ω@100MHz
Ferrite, 26Ω@100MHz, ±25%, 7mΩ, 6A, SMD 0603; Manufacturer: Murata Electronics; Manufacturer Part Number: BLM18SG260TN1D; Package Size: 0603; JLCPCB Basic Part: No; JLCPCB Part Number: C87063; Supplier 1: LCSC; Category: Ferrite Beads; Supplier Part Number 1: C87063; Tolerance: ±25%; Rated Current: 6A; DC Resistance: 7mΩ; RoHS: Yes; ComponentLink1Description: Datasheet; ComponentLink1URL: https://wmsc.lcsc.com/wmsc/upload/file/pdf/v2/lcsc/1810311116_Murata-Electronics-BLM18SG260TN1D_C87063.pdf; ComponentLink2Description: JLCPCB Part URL; ComponentLink2URL: https://jlcpcb.com/partdetail/C87063; ComponentLink3Description: LCSC Part URL; ComponentLink3URL: https://lcsc.com/product-detail/Ferrite-Beads_Murata-Electronics-Murata-Electronics-BLM18SG260TN1D_C87063.html
footprint FB-0603 (0603 (1608M) Ferrite)
pins: 1, 2

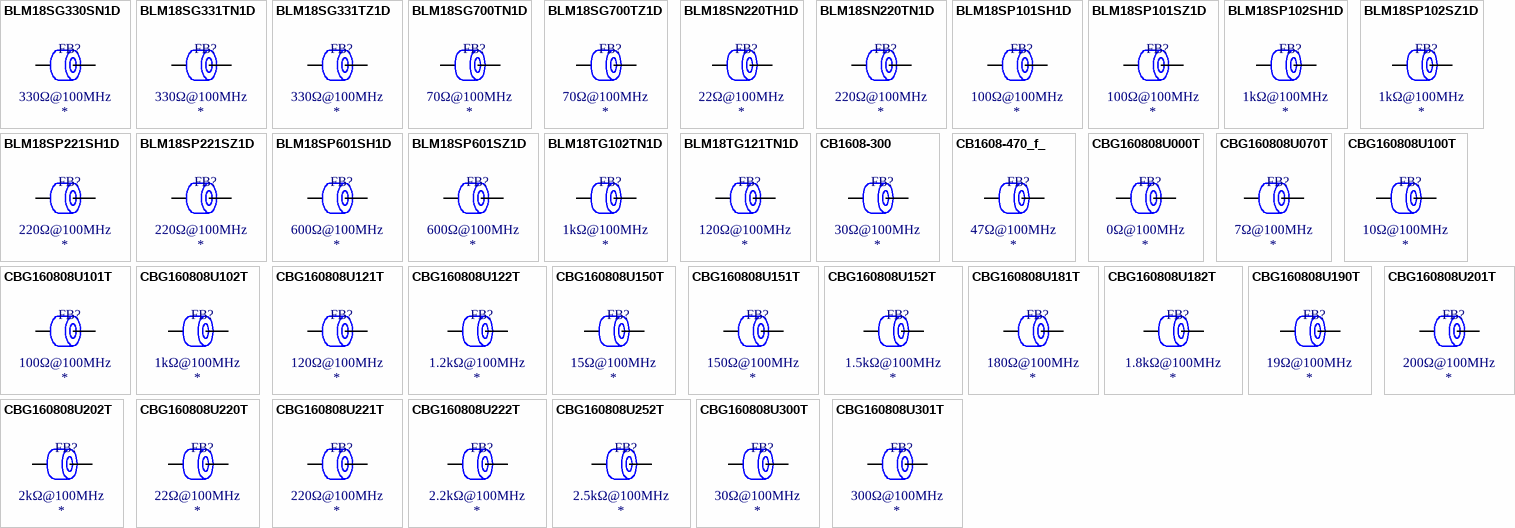
[diagram p5: symbols BLM18SG330SN1D to CBG160808U301T]

## BLM18SG330SN1D
designator FB?  Impedance @ Frequency: 330Ω@100MHz
Ferrite, 330Ω@100MHz, 8mΩ, SMD 0603; Manufacturer: Murata Electronics; Manufacturer Part Number: BLM18SG330SN1D; Package Size: 0603; JLCPCB Basic Part: No; JLCPCB Part Number: C576399; Supplier 1: LCSC; Category: Ferrite Beads; Supplier Part Number 1: C576399; DC Resistance: 8mΩ; RoHS: Yes; ComponentLink1Description: Datasheet; ComponentLink1URL: https://wmsc.lcsc.com/wmsc/upload/file/pdf/v2/lcsc/2308111547_Murata-Electronics-BLM18SG330SN1D_C576399.pdf; ComponentLink2Description: JLCPCB Part URL; ComponentLink2URL: https://jlcpcb.com/partdetail/C576399; ComponentLink3Description: LCSC Part URL; ComponentLink3URL: https://lcsc.com/product-detail/Ferrite-Beads_Murata-Electronics-Murata-Electronics-BLM18SG330SN1D_C576399.html
pins: 1, 2

## BLM18SG331TN1D
designator FB?  Impedance @ Frequency: 330Ω@100MHz
Ferrite, 330Ω@100MHz, ±25%, 70mΩ, 1.5A, SMD 0603; Manufacturer: Murata Electronics; Manufacturer Part Number: BLM18SG331TN1D; Package Size: 0603; JLCPCB Basic Part: No; JLCPCB Part Number: C88989; Supplier 1: LCSC; Category: Ferrite Beads; Supplier Part Number 1: C88989; Tolerance: ±25%; Rated Current: 1.5A; DC Resistance: 70mΩ; RoHS: Yes; ComponentLink1Description: Datasheet; ComponentLink1URL: https://wmsc.lcsc.com/wmsc/upload/file/pdf/v2/lcsc/2304140030_Murata-Electronics-BLM18SG331TN1D_C88989.pdf; ComponentLink2Description: JLCPCB Part URL; ComponentLink2URL: https://jlcpcb.com/partdetail/C88989; ComponentLink3Description: LCSC Part URL; ComponentLink3URL: https://lcsc.com/product-detail/Ferrite-Beads_Murata-Electronics-Murata-Electronics-BLM18SG331TN1D_C88989.html
footprint FB-0603 (0603 (1608M) Ferrite)
pins: 1, 2

## BLM18SG331TZ1D
designator FB?  Impedance @ Frequency: 330Ω@100MHz
Ferrite, 330Ω@100MHz, ±25%, 70mΩ, 1.5A, SMD 0603; Manufacturer: Murata Electronics; Manufacturer Part Number: BLM18SG331TZ1D; Package Size: 0603; JLCPCB Basic Part: No; JLCPCB Part Number: C710391; Supplier 1: LCSC; Category: Ferrite Beads; Supplier Part Number 1: C710391; Tolerance: ±25%; Rated Current: 1.5A; DC Resistance: 70mΩ; RoHS: Yes; ComponentLink1Description: Datasheet; ComponentLink1URL: https://wmsc.lcsc.com/wmsc/upload/file/pdf/v2/lcsc/2304140030_Murata-Electronics-BLM18SG331TZ1D_C710391.pdf; ComponentLink2Description: JLCPCB Part URL; ComponentLink2URL: https://jlcpcb.com/partdetail/C710391; ComponentLink3Description: LCSC Part URL; ComponentLink3URL: https://lcsc.com/product-detail/Ferrite-Beads_Murata-Electronics-Murata-Electronics-BLM18SG331TZ1D_C710391.html
footprint FB-0603 (0603 (1608M) Ferrite)
pins: 1, 2

## BLM18SG700TN1D
designator FB?  Impedance @ Frequency: 70Ω@100MHz
Ferrite, 70Ω@100MHz, ±25%, 20mΩ, 4A, SMD 0603; Manufacturer: Murata Electronics; Manufacturer Part Number: BLM18SG700TN1D; Package Size: 0603; JLCPCB Basic Part: No; JLCPCB Part Number: C113031; Supplier 1: LCSC; Category: Ferrite Beads; Supplier Part Number 1: C113031; Tolerance: ±25%; Rated Current: 4A; DC Resistance: 20mΩ; RoHS: Yes; ComponentLink1Description: Datasheet; ComponentLink1URL: https://wmsc.lcsc.com/wmsc/upload/file/pdf/v2/lcsc/1810311110_Murata-Electronics-BLM18SG700TN1D_C113031.pdf; ComponentLink2Description: JLCPCB Part URL; ComponentLink2URL: https://jlcpcb.com/partdetail/C113031; ComponentLink3Description: LCSC Part URL; ComponentLink3URL: https://lcsc.com/product-detail/Ferrite-Beads_Murata-Electronics-Murata-Electronics-BLM18SG700TN1D_C113031.html
footprint FB-0603 (0603 (1608M) Ferrite)
pins: 1, 2

## BLM18SG700TZ1D
designator FB?  Impedance @ Frequency: 70Ω@100MHz
Ferrite, 70Ω@100MHz, ±25%, 20mΩ, 4A, SMD 0603; Manufacturer: Murata Electronics; Manufacturer Part Number: BLM18SG700TZ1D; Package Size: 0603; JLCPCB Basic Part: No; JLCPCB Part Number: C882974; Supplier 1: LCSC; Category: Ferrite Beads; Supplier Part Number 1: C882974; Tolerance: ±25%; Rated Current: 4A; DC Resistance: 20mΩ; RoHS: Yes; ComponentLink1Description: Datasheet; ComponentLink1URL: https://wmsc.lcsc.com/wmsc/upload/file/pdf/v2/lcsc/2201242130_Murata-Electronics-BLM18SG700TZ1D_C882974.pdf; ComponentLink2Description: JLCPCB Part URL; ComponentLink2URL: https://jlcpcb.com/partdetail/C882974; ComponentLink3Description: LCSC Part URL; ComponentLink3URL: https://lcsc.com/product-detail/Ferrite-Beads_Murata-Electronics-Murata-Electronics-BLM18SG700TZ1D_C882974.html
footprint FB-0603 (0603 (1608M) Ferrite)
pins: 1, 2